# Altium footprint library PCB_LIB.PcbLib: 116 footprints (part 5 of 8)
Each footprint in its own frame and in the unit in brackets; x right, y up, seen from the top. Pads: shape width x height; smd on the part's side, far side on the other; paste and mask are expansions set on the pad; w line width, h text height; cw(c..) or ccw(c..) is an arc to the next point about the centre after c.
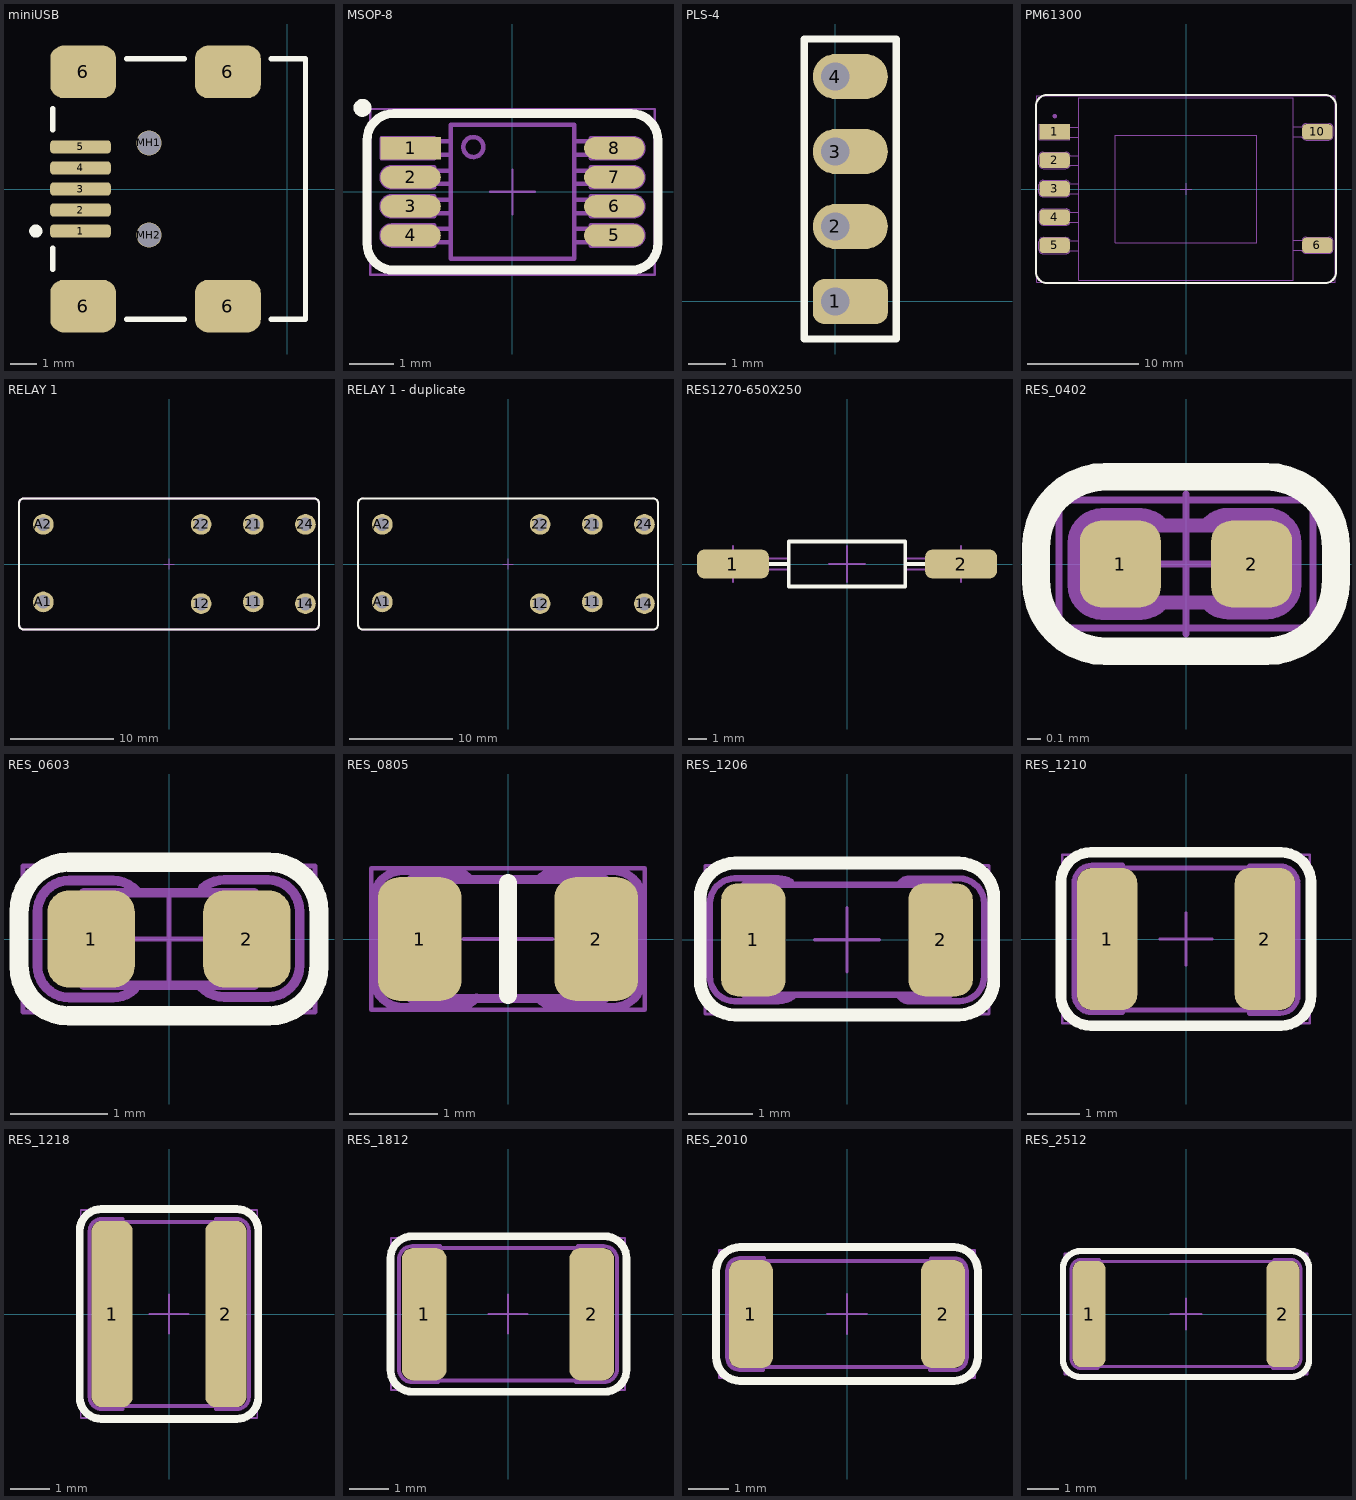
[diagram p4: the footprints below, top view; thin cyan lines are the x and y axes]

## miniUSB [mm] "Connector; USB2.0, Type B, SM; 5 Position; Right Angle"
height 3.9
pads (11):
  rrect50% 2.3x0.5 smd: 1(-7.85,-1.6) 2(-7.85,-0.8) 3(-7.85,0) 4(-7.85,0.8) 5(-7.85,1.6)
  rrect50% 2.5x2 smd: 6(-7.75,-4.45) 6(-7.75,4.45) 6(-2.25,-4.45) 6(-2.25,4.45)
  round 0.95 hole 0.9 unplated: MH1(-5.25,1.75) MH2(-5.25,-1.75)
Top Overlay:
  circle w0.25: c-9.55,-1.6 r0.125
  lines w0.2: -8.9,-3.05 -8.9,-2.25 ; -8.9,2.25 -8.9,3.05 ; -6.1,-4.95 -3.9,-4.95 ; -6.1,4.95 -3.9,4.95 ; -0.6,-4.95 0.7,-4.95 0.7,4.95 -0.6,4.95
3D body "mini-usb2.stp": height 3.93, standoff -0.05, extent -8.825,-5.1 0.425,4.8

## MSOP-8 [mm]
height 1.1
pads (8):
  rect 1.35x0.5 smd: 1(-2.275,0.975)
  oval 1.35x0.5 smd: 2(-2.275,0.325) 3(-2.275,-0.325) 4(-2.275,-0.975) 5(2.275,-0.975) 6(2.275,-0.325) 7(2.275,0.325) 8(2.275,0.975)
Top Overlay:
  circle w0.2: c-3.35,1.875 r0.1
  lines w0.2: 2.625,-1.75 -0.5,-1.75 -2.65,-1.75 cw(c-2.65,-1.15) -3.25,-1.15 -3.25,1.15 cw(c-2.65,1.15) -2.65,1.75 2.65,1.75 cw(c2.65,1.15) 3.25,1.15 3.25,-1.125 ; 2.65,-1.75 ccw(c2.65,-1.15) 3.25,-1.15
Mechanical 14:
  circle w0.1: c-0.875,1 r0.224
  lines w0.1: -1.75,-1.2 -2.7,-1.2 cw(c-2.7,-0.975) -2.7,-0.75 -1.75,-0.75 -1.75,-0.825 ; -1.75,-0.55 -2.7,-0.55 cw(c-2.7,-0.325) -2.7,-0.1 -1.75,-0.1 -1.75,-0.175 ; -1.75,0.1 -2.7,0.1 cw(c-2.7,0.325) -2.7,0.55 -1.75,0.55 -1.75,0.475 ; -1.75,0.75 -2.7,0.75 -2.925,0.75 -2.925,1.2 -2.7,1.2 -1.75,1.2 -1.75,1.125 ; -1.375,-1.125 -2.5,-1.125 -2.5,-0.825 -1.375,-0.825 ; -1.375,-0.475 -2.5,-0.475 -2.5,-0.175 -1.375,-0.175 ; -1.375,0.175 -2.5,0.175 -2.5,0.475 -1.375,0.475 ; -1.375,0.825 -2.5,0.825 -2.5,1.125 -1.375,1.125 ; 1.375,-1.125 2.5,-1.125 2.5,-0.825 1.375,-0.825 ; 1.375,-0.475 2.5,-0.475 2.5,-0.175 1.375,-0.175 ; 1.375,0.175 2.5,0.175 2.5,0.475 1.375,0.475 ; 1.375,0.825 2.5,0.825 2.5,1.125 1.375,1.125 ; 1.75,-1.125 1.75,-1.2 2.7,-1.2 ccw(c2.7,-0.975) 2.7,-0.75 1.75,-0.75 ; 1.75,-0.475 1.75,-0.55 2.7,-0.55 ccw(c2.7,-0.325) 2.7,-0.1 1.75,-0.1 ; 1.75,0.175 1.75,0.1 2.7,0.1 ccw(c2.7,0.325) 2.7,0.55 1.75,0.55 ; 1.75,0.825 1.75,0.75 2.7,0.75 ccw(c2.7,0.975) 2.7,1.2 1.75,1.2 ; -1.375,-1.5 -1.375,1.5 1.375,1.5 1.375,-1.5 -1.375,-1.5
  text ".Comment" at -2.475,-3.125 h1.5
  text ".Designator" at -2.5,-0.475 h1.2
Mechanical 15:
  lines w0.05: -0.5,0 0.5,0 ; 0,-0.5 0,0.5 ; -3.175,-1.85 -3.175,1.85 3.175,1.85 3.175,-1.85 -3.175,-1.85
3D body "MSOP-8.STEP": height 1.1, standoff 0, extent -2.46,-1.5 2.46,1.5

## PLS-4 [mm] "Connector; Header; 1x4 Position"
height 6
pads (4):
  rrect50% 2x1.2 hole 0.75 copper offset 0.4,0: 1(0,0)
  oval 2x1.2 hole 0.75 copper offset 0.4,0: 2(0,2) 3(0,4) 4(0,6)
Top Overlay:
  lines w0.2: -0.825,-1 1.625,-1 1.625,7 -0.825,7 -0.825,-1

## PM61300 [mm] "Transformer"
pads (7):
  rect 2.75x1.4 smd: 1(-11.875,5.15)
  rrect50% 2.75x1.4 smd: 2(-11.875,2.587) 3(-11.875,0.025) 4(-11.875,-2.538) 5(-11.875,-5.1) 6(11.875,-5.1) 10(11.875,5.15)
Top Overlay:
  lines w0.2: -13.55,-7.5 ccw(c-12.55,-7.5) -12.55,-8.5 12.55,-8.5 ccw(c12.55,-7.5) 13.55,-7.5 13.55,7.5 ccw(c12.55,7.5) 12.55,8.5 -12.55,8.5 ccw(c-12.55,7.5) -13.55,7.5 -13.55,2.575 -13.55,-7.5
Mechanical 14:
  circle w0.2: c-11.852,6.585 r0.1
  lines w0.1: -10.5,4.675 -10.5,4.45 -13.25,4.45 -13.25,5.85 -10.5,5.85 -10.5,5.575 ; -10.476,-5.587 cw(c-10.852,-5.45) -10.85,-5.85 -12.9,-5.85 cw(c-12.899,-5.45) -13.299,-5.452 -13.299,-4.774 -13.298,-4.774 cw(c-12.898,-4.775) -12.9,-4.375 -10.85,-4.375 cw(c-10.851,-4.775) -10.475,-4.638 ; -10.476,-0.437 cw(c-10.852,-0.3) -10.85,-0.7 -12.9,-0.7 cw(c-12.899,-0.3) -13.299,-0.302 -13.299,0.376 -13.298,0.376 cw(c-12.898,0.375) -12.9,0.775 -10.85,0.775 cw(c-10.851,0.375) -10.475,0.512 ; -10.476,2.113 cw(c-10.852,2.25) -10.85,1.85 -12.9,1.85 cw(c-12.899,2.25) -13.299,2.248 -13.299,2.926 -13.298,2.926 cw(c-12.898,2.925) -12.9,3.325 -10.85,3.325 cw(c-10.851,2.925) -10.475,3.062 ; -10.451,-3.012 cw(c-10.827,-2.875) -10.825,-3.275 -12.875,-3.275 cw(c-12.874,-2.875) -13.274,-2.877 -13.274,-2.199 -13.273,-2.199 cw(c-12.873,-2.2) -12.875,-1.8 -10.825,-1.8 cw(c-10.826,-2.2) -10.45,-2.063 ; -9.7,-5.575 -12.95,-5.575 -12.95,-4.675 -9.7,-4.675 ; -9.7,-0.425 -12.95,-0.425 -12.95,0.475 -9.7,0.475 ; -9.7,2.125 -12.95,2.125 -12.95,3.025 -9.7,3.025 ; -9.7,4.675 -12.95,4.675 -12.95,5.575 -9.7,5.575 ; -9.675,-3 -12.925,-3 -12.925,-2.1 -9.675,-2.1 ; 9.7,-5.525 12.95,-5.525 12.95,-4.625 9.7,-4.625 ; 9.7,4.725 12.95,4.725 12.95,5.625 9.7,5.625 ; 10.475,-5.562 ccw(c10.851,-5.425) 10.85,-5.825 12.9,-5.825 ccw(c12.898,-5.425) 13.298,-5.426 13.299,-5.426 13.299,-4.748 ccw(c12.899,-4.75) 12.9,-4.35 10.85,-4.35 ccw(c10.852,-4.75) 10.476,-4.613 ; 10.475,4.688 ccw(c10.851,4.825) 10.85,4.425 12.9,4.425 ccw(c12.898,4.825) 13.298,4.824 13.299,4.824 13.299,5.502 ccw(c12.899,5.5) 12.9,5.9 10.85,5.9 ccw(c10.852,5.5) 10.476,5.637 ; -9.7,-8.25 -9.7,8.25 9.7,8.25 9.7,-8.25 -9.7,-8.25 ; -6.4,-4.85 -6.4,4.85 -1.8,4.85 6.4,4.85 6.4,-4.85 -6.4,-4.85
  text ".Comment" at -2.325,-10.3 h1.5
  text ".Designator" at -10.3,-1.85 h5
Mechanical 15:
  lines w0.05: -0.5,0 0.5,0 ; 0,-0.5 0,0.5 ; -13.475,-8.425 -13.475,8.425 13.475,8.425 13.475,-8.425 -9.05,-8.425 -13.475,-8.425
3D body "pm61300.stp": height 7.2, standoff 0, extent -13,-8.25 13,8.25

## RELAY 1 [mm]
height 15.7
pads (8):
  round 2 hole 1.3: 11(8.15,-3.67) 12(3.11,-3.83) 14(13.19,-3.83) 21(8.15,3.83) 22(3.11,3.83) 24(13.19,3.83) A1(-12.15,-3.67) A2(-12.15,3.83)
Top Overlay:
  lines w0.2: -14.5,-5.85 ccw(c-14,-5.85) -14,-6.35 14,-6.35 ccw(c14,-5.85) 14.5,-5.85 14.5,5.85 ccw(c14,5.85) 14,6.35 -14,6.35 ccw(c-14,5.85) -14.5,5.85 -14.5,-5.85
Mechanical 8:
  lines w0.1: -12.65,-3.67 -12.15,-3.67 ; -12.65,3.83 -12.15,3.83 ; -12.15,-4.17 -12.15,-3.67 ; -12.15,-3.17 -12.15,-3.67 ; -12.15,3.33 -12.15,3.83 ; -12.15,4.33 -12.15,3.83 ; -11.65,-3.67 -12.15,-3.67 ; -11.65,3.83 -12.15,3.83 ; -0.5,0 0,0 ; 0,-0.5 0,0 ; 0,0.5 0,0 ; 0.5,0 0,0 ; 2.61,-3.83 3.11,-3.83 ; 2.61,3.83 3.11,3.83 ; 3.11,-4.33 3.11,-3.83 ; 3.11,-3.33 3.11,-3.83 ; 3.11,3.33 3.11,3.83 ; 3.11,4.33 3.11,3.83 ; 3.61,-3.83 3.11,-3.83 ; 3.61,3.83 3.11,3.83 ; 7.65,-3.67 8.15,-3.67 ; 7.65,3.83 8.15,3.83 ; 8.15,-4.17 8.15,-3.67 ; 8.15,-3.17 8.15,-3.67 ; 8.15,3.33 8.15,3.83 ; 8.15,4.33 8.15,3.83 ; 8.65,-3.67 8.15,-3.67 ; 8.65,3.83 8.15,3.83 ; 12.69,-3.83 13.19,-3.83 ; 12.69,3.83 13.19,3.83 ; 13.19,-4.33 13.19,-3.83 ; 13.19,-3.33 13.19,-3.83 ; 13.19,3.33 13.19,3.83 ; 13.19,4.33 13.19,3.83 ; 13.69,-3.83 13.19,-3.83 ; 13.69,3.83 13.19,3.83
Mechanical 14:
  lines w0.2: -14.5,-5.85 ccw(c-14,-5.85) -14,-6.35 14,-6.35 ccw(c14,-5.85) 14.5,-5.85 14.5,5.85 ccw(c14,5.85) 14,6.35 -14,6.35 ccw(c-14,5.85) -14.5,5.85 -14.5,-5.85
  text ".Designator" at -10.5,-2.1 h5
3D body "User Library-RT2.step": height 15.71, standoff -3.6, extent -14.6,-6.3 14.4,6.4

## RELAY 1 - duplicate [mm] "8 Leads, Row Spacing 7.62 mm; Body 29mm x 12.7mm, TYCO RT Serie"
height 15.7
pads (8):
  round 2 hole 1.3: 11(8.15,-3.67) 12(3.11,-3.83) 14(13.19,-3.83) 21(8.15,3.83) 22(3.11,3.83) 24(13.19,3.83) A1(-12.15,-3.67) A2(-12.15,3.83)
Top Overlay:
  lines w0.2: -14.5,-5.85 ccw(c-14,-5.85) -14,-6.35 14,-6.35 ccw(c14,-5.85) 14.5,-5.85 14.5,5.85 ccw(c14,5.85) 14,6.35 -14,6.35 ccw(c-14,5.85) -14.5,5.85 -14.5,-5.85
Mechanical 8:
  lines w0.1: -12.65,-3.67 -12.15,-3.67 ; -12.65,3.83 -12.15,3.83 ; -12.15,-4.17 -12.15,-3.67 ; -12.15,-3.17 -12.15,-3.67 ; -12.15,3.33 -12.15,3.83 ; -12.15,4.33 -12.15,3.83 ; -11.65,-3.67 -12.15,-3.67 ; -11.65,3.83 -12.15,3.83 ; -0.5,0 0,0 ; 0,-0.5 0,0 ; 0,0.5 0,0 ; 0.5,0 0,0 ; 2.61,-3.83 3.11,-3.83 ; 2.61,3.83 3.11,3.83 ; 3.11,-4.33 3.11,-3.83 ; 3.11,-3.33 3.11,-3.83 ; 3.11,3.33 3.11,3.83 ; 3.11,4.33 3.11,3.83 ; 3.61,-3.83 3.11,-3.83 ; 3.61,3.83 3.11,3.83 ; 7.65,-3.67 8.15,-3.67 ; 7.65,3.83 8.15,3.83 ; 8.15,-4.17 8.15,-3.67 ; 8.15,-3.17 8.15,-3.67 ; 8.15,3.33 8.15,3.83 ; 8.15,4.33 8.15,3.83 ; 8.65,-3.67 8.15,-3.67 ; 8.65,3.83 8.15,3.83 ; 12.69,-3.83 13.19,-3.83 ; 12.69,3.83 13.19,3.83 ; 13.19,-4.33 13.19,-3.83 ; 13.19,-3.33 13.19,-3.83 ; 13.19,3.33 13.19,3.83 ; 13.19,4.33 13.19,3.83 ; 13.69,-3.83 13.19,-3.83 ; 13.69,3.83 13.19,3.83
Mechanical 14:
  lines w0.1: -14.5,-5.85 ccw(c-14,-5.85) -14,-6.35 14,-6.35 ccw(c14,-5.85) 14.5,-5.85 14.5,5.85 ccw(c14,5.85) 14,6.35 -14,6.35 ccw(c-14,5.85) -14.5,5.85 -14.5,-5.85
3D body "REL_TYCO_SCHRACK_RT314012.stp": height 15.7, standoff -3.6, extent -14.5,-6.35 14.5,6.35

## RES1270-650X250 [mm] "Resistor, Axial, Pad spacing 10.16 mm - Body Lengh 6.6mm X Body Diameter 2.5mm"
height 2.5
pads (2):
  rrect50% 4x1.6 smd: 1(-6.35,0) 2(6.35,0)
Top Overlay:
  lines w0.2: -5.2,0 -3.25,0 ; 3.25,0 5.2,0 ; -3.25,-1.25 3.25,-1.25 3.25,1.25 -3.25,1.25 -3.25,-1.25
Mechanical 8:
  lines w0.1: -7.35,0 -6.35,0 ; -6.35,-1 -6.35,0 ; -6.35,1 -6.35,0 ; -5.35,0 -6.35,0 ; -1,0 0,0 ; 0,-1 0,0 ; 0,1 0,0 ; 1,0 0,0 ; 5.35,0 6.35,0 ; 6.35,-1 6.35,0 ; 6.35,1 6.35,0 ; 7.35,0 6.35,0
Mechanical 14:
  lines w0.1: -3.25,-0.3 -6.336,-0.3 cw(c-6.35,0) -6.343,0.3 -3.25,0.3 ; 3.25,-0.3 6.35,-0.3 ccw(c6.35,0) 6.35,0.3 3.25,0.3 ; -3.25,-1.25 -3.25,1.25 3.25,1.25 3.25,-1.25 -3.25,-1.25
3D body "RES1270-650X250.stp": height 6, standoff -0.1, extent -6.65,-1.25 6.65,1.25

## RES_0402 [mm] "Chip Resistor, EIA 0402, Metric 1005, Body 1.0x0.5mm, IPC Medium Density"
height 0.4
pads (2):
  rrect50% 0.58x0.62 smd: 1(-0.47,0) 2(0.47,0)
Top Overlay:
  lines w0.2: -1.075,-0.125 ccw(c-0.575,-0.125) -0.575,-0.625 0.575,-0.625 ccw(c0.575,-0.125) 1.075,-0.125 1.075,0.125 ccw(c0.575,0.125) 0.575,0.625 -0.575,0.625 ccw(c-0.575,0.125) -1.075,0.125 -1.075,-0.125
Mechanical 14:
  lines w0.1: -0.171,-0.278 cw(c-0.325,-0.15) -0.325,-0.35 -0.6,-0.35 cw(c-0.6,-0.15) -0.8,-0.15 ; -0.171,0.278 ccw(c-0.325,0.15) -0.325,0.35 -0.6,0.35 ccw(c-0.6,0.15) -0.8,0.15 -0.8,-0.15 ; 0.15,-0.275 ccw(c0.304,-0.147) 0.304,-0.347 0.579,-0.347 ccw(c0.579,-0.147) 0.779,-0.147 0.779,0.153 ccw(c0.579,0.153) 0.579,0.353 0.304,0.353 ccw(c0.304,0.153) 0.15,0.281 ; -0.8,-0.15 -0.8,-0.15 ; -0.525,-0.275 0.525,-0.275 0.525,0.275 -0.525,0.275 -0.525,-0.275
  text ".Designator" at -0.8,-0.15 h0.4
  text ".Comment" at -0.508,-0.635 h0.3
Mechanical 15:
  lines w0.05: -0.5,0 0.5,0 ; 0,-0.5 0,0.5 ; -0.91,-0.46 -0.91,0.46 0.91,0.46 0.91,-0.46 -0.91,-0.46
3D body "RESC1005X40N.stp": height 0.4, standoff 0, extent -0.525,-0.275 0.525,0.275

## RES_0603 [mm] "Chip Resistor, EIA 0603, Metric 1608, Body 1.6x0.8mm, IPC Medium Density"
height 0.55
pads (2):
  rrect50% 0.9x1 smd: 1(-0.8,0) 2(0.8,0)
Top Overlay:
  lines w0.2: -1.54,-0.275 ccw(c-1.025,-0.275) -1.025,-0.79 1.025,-0.79 ccw(c1.025,-0.275) 1.54,-0.275 1.54,0.275 ccw(c1.025,0.275) 1.025,0.79 -1.025,0.79 ccw(c-1.025,0.275) -1.54,0.275 -1.54,-0.275
Mechanical 14:
  lines w0.1: -0.358,-0.519 cw(c-0.575,-0.275) -0.575,-0.601 ; -0.333,0.493 ccw(c-0.575,0.275) -0.575,0.601 -1.025,0.601 ccw(c-1.025,0.275) -1.351,0.275 -1.351,-0.275 ccw(c-1.025,-0.275) -1.025,-0.601 -0.575,-0.601 ; 0.324,-0.487 ccw(c0.567,-0.269) 0.567,-0.595 1.017,-0.595 ccw(c1.017,-0.269) 1.343,-0.269 1.343,0.281 ccw(c1.017,0.281) 1.017,0.607 0.567,0.607 ; 0.35,0.525 cw(c0.567,0.281) 0.567,0.607 ; -0.575,-0.601 -0.575,-0.601 ; 0.567,0.607 0.567,0.607 ; -0.875,-0.475 -0.875,0.475 0.875,0.475 0.875,-0.475 -0.875,-0.475
  text ".Designator" at -1.397,-0.127 h0.7
  text ".Comment" at -0.508,-0.381 h0.3
Mechanical 15:
  lines w0.05: -0.5,0 0.5,0 ; 0,-0.5 0,0.5 ; -1.5,-0.75 1.5,-0.75 1.5,0.75 -1.5,0.75 -1.5,-0.75
3D body "RESC1608X55N.stp": height 0.55, standoff 0, extent -0.875,-0.475 0.875,0.475

## RES_0805 [mm] "Chip Resistor, EIA 0805, Metric 2012, Body 2.0x1.2mm, IPC Medium Density"
height 0.6
pads (2):
  rrect50% 0.95x1.4 smd: 1(-1,0) 2(1,0)
Top Overlay:
  lines w0.2: 0,-0.635 0,0.635
Mechanical 14:
  lines w0.1: -0.635,0.775 cw(c-0.635,0.517) -0.429,0.672 ; -0.6,0.775 -1.187,0.775 ; -0.355,-0.67 cw(c-0.6,-0.437) -0.6,-0.775 ; 0.354,-0.672 ccw(c0.56,-0.517) 0.56,-0.775 1.187,-0.775 ccw(c1.187,-0.437) 1.525,-0.437 1.525,0.437 ccw(c1.187,0.437) 1.187,0.775 0.565,0.775 ccw(c0.565,0.509) 0.354,0.672 ; -1.525,0.437 cw(c-1.187,0.437) -1.187,0.775 ; -1.525,0.437 -1.525,0.437 ; -1.525,0.437 -1.525,-0.437 ccw(c-1.187,-0.437) -1.187,-0.775 -0.6,-0.775 ; -1.187,0.775 -1.187,0.775 ; -0.6,-0.775 -0.6,-0.775 ; -1.1,-0.675 -1.1,0.675 1.1,0.675 1.1,-0.675 -1.1,-0.675
  text ".Designator" at -2.05,-0.4 h0.6
Mechanical 15:
  lines w0.05: -0.5,0 0.5,0 ; 0,-0.5 0,0.5 ; -1.55,-0.8 1.55,-0.8 1.55,0.8 -1.55,0.8 -1.55,-0.8
3D body "RESC2012X60N.stp": height 0.6, standoff 0, extent -1.1,-0.675 1.1,0.675

## RES_1206 [mm] "Chip Resistor, EIA 1206, Metric 3016, Body 3.05x1.55mm, IPC Medium Density"
height 0.65
pads (2):
  rrect50% 1x1.75 smd: 1(-1.45,0) 2(1.45,0)
Top Overlay:
  lines w0.2: -1.736,1.189 ccw(c-1.736,1.189) -1.736,1.189 ; -1.736,1.189 ccw(c-1.736,0.65) -2.275,0.65 -2.275,-0.625 ccw(c-1.736,-0.625) -1.736,-1.164 1.736,-1.164 ccw(c1.736,-0.625) 2.275,-0.625 2.275,0.65 ccw(c1.736,0.65) 1.736,1.189 -1.736,1.189
Mechanical 14:
  lines w0.1: -2.127,0.562 -2.125,0.562 ; -1.738,0.95 ccw(c-1.738,0.562) -2.125,0.562 ; -1.738,0.952 -1.063,0.952 cw(c-1.063,0.563) -0.868,0.9 ; -0.832,-0.874 cw(c-1.062,-0.562) -1.062,-0.95 -1.062,-0.952 -1.737,-0.952 cw(c-1.737,-0.563) -2.127,-0.563 -2.125,-0.563 -2.125,0.562 ; 0.821,-0.883 ccw(c0.971,-0.759) 0.971,-0.954 1.738,-0.954 ; 0.836,0.89 cw(c0.97,0.769) 0.97,0.95 1.737,0.95 cw(c1.737,0.561) 2.127,0.561 ; 1.738,-0.952 ccw(c1.738,-0.564) 2.125,-0.564 2.125,0.561 ; -1.6,-0.85 1.6,-0.85 1.6,0.85 -1.6,0.85 -1.6,-0.85
  text ".Comment" at -0.889,-0.635 h0.6
  text ".Designator" at -2.413,-0.127 h1.2
Mechanical 15:
  lines w0.05: -0.5,0 0.5,0 ; 0,-0.5 0,0.5 ; -2.2,-1.15 -2.2,1.15 2.2,1.15 2.2,-1.15 -2.2,-1.15
3D body "RESC3016X65N.stp": height 0.65, standoff 0, extent -1.6,-0.85 1.6,0.85

## RES_1210 [mm] "Chip Resistor, EIA 1210, Metric 3225, Body 3.2x2.5mm, IPC Medium Density"
height 0.7
pads (2):
  rrect50% 1.15x2.7 smd: 1(-1.5,0) 2(1.5,0)
Top Overlay:
  lines w0.2: -2.375,-1.1 -2.375,1.075 cw(c-1.804,1.075) -1.804,1.646 1.804,1.646 cw(c1.804,1.075) 2.375,1.075 ; -2.375,-1.075 ccw(c-1.804,-1.075) -1.804,-1.646 1.804,-1.646 ccw(c1.804,-1.075) 2.375,-1.075 2.375,1.1
Mechanical 14:
  lines w0.1: -1.212,-1.398 -1.787,-1.398 cw(c-1.787,-1.06) -2.125,-1.06 ; -1.213,1.4 -1.787,1.4 ccw(c-1.787,1.062) -2.125,1.062 -2.125,-1.06 ; 1.213,-1.41 1.787,-1.41 ccw(c1.787,-1.072) 2.125,-1.072 2.125,1.05 ccw(c1.787,1.05) 1.787,1.388 1.212,1.388 ; -2.125,-1.06 -2.125,-1.06 ; -1.7,-1.35 -1.7,1.35 1.7,1.35 1.7,-1.35 -1.7,-1.35
  text ".Comment" at -1.016,-1.016 h0.6
  text ".Designator" at -3.175,-0.127 h1.52
Mechanical 15:
  lines w0.05: -0.5,0 0.5,0 ; 0,-0.5 0,0.5 ; -2.35,-1.6 -2.35,1.6 2.35,1.6 2.35,-1.6 -2.35,-1.6
3D body "RESC3225X70N.stp": height 0.7, standoff 0, extent -1.7,-1.35 1.7,1.35

## RES_1218 [mm] "Chip Resistor, EIA 1218, Metric 3146, 2-Leads, Body 4.6x3.1mm, IPC Medium Density"
height 0.65
pads (2):
  rrect50% 1.05x4.75 smd: 1(-1.45,0) 2(1.45,0)
Top Overlay:
  lines w0.2: -2.275,-2.125 ccw(c-1.725,-2.125) -1.725,-2.675 1.725,-2.675 ccw(c1.725,-2.125) 2.275,-2.125 2.275,2.125 ccw(c1.725,2.125) 1.725,2.675 -1.725,2.675 ccw(c-1.725,2.125) -2.275,2.125 -2.275,-2.125
Mechanical 14:
  lines w0.1: -1.188,-2.425 -1.713,-2.425 cw(c-1.713,-2.113) -2.025,-2.113 ; 1.2,-2.426 1.725,-2.426 ccw(c1.725,-2.113) 2.038,-2.113 2.038,2.112 ccw(c1.725,2.112) 1.725,2.425 1.2,2.425 ; -2.025,-2.113 -2.025,-2.113 ; -2.025,-2.113 -2.025,2.113 cw(c-1.713,2.113) -1.713,2.425 -1.187,2.425 ; -1.187,2.425 -1.187,2.425 ; -1.7,-2.35 -1.7,2.35 1.7,2.35 1.7,-2.35 -1.7,-2.35
  text ".Designator" at -0.001,-4 h1.9
  text ".Comment" at 1.473,-2.21 h0.9
Mechanical 15:
  lines w0.05: -0.5,0 0.5,0 ; 0,-0.5 0,0.5 ; -2.25,-2.65 -2.25,2.65 2.25,2.65 2.25,-2.65 -2.25,-2.65
3D body "RESC3146X65N.stp": height 0.65, standoff 0, extent -1.7,-2.35 1.7,2.35

## RES_1812 [mm] "Chip Resistor, EIA 1812, Metric 4532, 2-Leads, Body 4.5x3.2mm, IPC Medium Density"
height 0.7
pads (2):
  rrect50% 1.15x3.4 smd: 1(-2.15,0) 2(2.15,0)
Top Overlay:
  lines w0.2: -3.016,-1.425 ccw(c-2.45,-1.425) -2.45,-1.991 2.475,-1.991 ccw(c2.475,-1.425) 3.041,-1.425 3.041,1.434 ccw(c2.475,1.434) 2.475,2 -2.45,2 ccw(c-2.45,1.434) -3.016,1.434 -3.016,-1.425
Mechanical 14:
  lines w0.1: -1.8,-1.748 -2.45,-1.748 cw(c-2.45,-1.4) -2.798,-1.4 ; -1.75,1.748 -2.45,1.748 ccw(c-2.45,1.4) -2.798,1.4 -2.798,-1.4 ; 1.75,-1.748 2.45,-1.748 ccw(c2.45,-1.4) 2.798,-1.4 2.798,1.4 ccw(c2.45,1.4) 2.45,1.748 1.8,1.748 ; -2.798,-1.4 -2.798,-1.4 ; -2.375,-1.7 2.375,-1.7 2.375,1.7 -2.375,1.7 -2.375,-1.7
  text ".Comment" at -1.524,-1.524 h0.9
  text ".Designator" at -4.445,-0.254 h2.2
Mechanical 15:
  lines w0.05: -0.5,0 0.5,0 ; 0,-0.5 0,0.5 ; -3,-1.95 -3,1.95 3,1.95 3,-1.95 -3,-1.95
3D body "RESC4532X70N.stp": height 0.7, standoff 0, extent -2.35,-1.7 2.35,1.7

## RES_2010 [mm] "Resistor, Chip; 5mm L X 2.5mm W X 0.65mm H, IPC Medium Density"
height 0.65
pads (2):
  rrect50% 1.1x2.7 smd: 1(-2.4,0) 2(2.4,0)
Top Overlay:
  lines w0.2: -3.269,-1.075 ccw(c-2.675,-1.075) -2.675,-1.669 2.675,-1.669 ccw(c2.675,-1.075) 3.269,-1.075 3.269,1.075 ccw(c2.675,1.075) 2.675,1.669 -2.675,1.669 ccw(c-2.675,1.075) -3.269,1.075 -3.269,-1.075
Mechanical 14:
  lines w0.1: -2.1,-1.396 -2.688,-1.396 cw(c-2.688,-1.087) -2.996,-1.087 ; -2.075,1.396 -2.687,1.396 ccw(c-2.687,1.088) -2.996,1.088 -2.996,-1.087 ; 2.075,-1.4 2.687,-1.4 ccw(c2.687,-1.091) 2.996,-1.091 2.996,1.084 ccw(c2.688,1.084) 2.688,1.392 2.1,1.392 ; -2.996,-1.087 -2.996,-1.087 ; -2.55,-1.325 -2.55,1.325 2.55,1.325 2.55,-1.325 -2.55,-1.325
  text ".Comment" at -2.642,-1.219 h1
  text ".Designator" at -7.214,-1.092 h2
Mechanical 15:
  lines w0.05: -0.5,0 0.5,0 ; 0,-0.5 0,0.5 ; -3.2,-1.6 -3.2,1.6 3.2,1.6 3.2,-1.6 -3.2,-1.6
3D body "RESC5025X65N.stp": height 0.65, standoff 0, extent -2.55,-1.325 2.55,1.325

## RES_2512 [mm] "EIA 2512, Metric 6432, 2-Leads, Resistor, Chip; 6.35mm L X 3.20mm W X 0.69mm H, IPC Medium Density"
height 0.69
pads (2):
  rrect50% 1.05x3.4 smd: 1(-3.1,0) 2(3.1,0)
Top Overlay:
  lines w0.2: -3.939,-1.45 ccw(c-3.375,-1.45) -3.375,-2.014 3.375,-2.014 ccw(c3.375,-1.45) 3.939,-1.45 3.939,1.45 ccw(c3.375,1.45) 3.375,2.014 -3.375,2.014 ccw(c-3.375,1.45) -3.939,1.45 -3.939,-1.45
Mechanical 14:
  lines w0.1: -2.825,-1.75 -3.35,-1.75 cw(c-3.35,-1.425) -3.675,-1.425 -3.675,1.425 cw(c-3.35,1.425) -3.35,1.75 -2.775,1.75 ; 2.775,-1.75 3.35,-1.75 ccw(c3.35,-1.425) 3.675,-1.425 3.675,1.425 ccw(c3.35,1.425) 3.35,1.75 2.825,1.75 ; -3.25,-1.675 3.25,-1.675 3.25,1.675 -3.25,1.675 -3.25,-1.675
  text ".Comment" at -3.277,-1.499 h1.2
  text ".Designator" at -5.105,-0.432 h2.5
Mechanical 15:
  lines w0.05: -0.5,0 0.5,0 ; 0,-0.5 0,0.5 ; -3.9,-1.95 3.9,-1.95 3.9,1.95 -3.9,1.95 -3.9,-1.95
3D body "RESC6432X69N.stp": height 0.7, standoff 0, extent -3.25,-1.675 3.25,1.675